# Altium footprint library CAD_Footprints.PcbLib: 39 footprints (part 2 of 3)
Each footprint in its own frame and in the unit in brackets; x right, y up, seen from the top. Pads: shape width x height; smd on the part's side, far side on the other; paste and mask are expansions set on the pad; w line width, h text height; cw(c..) or ccw(c..) is an arc to the next point about the centre after c.
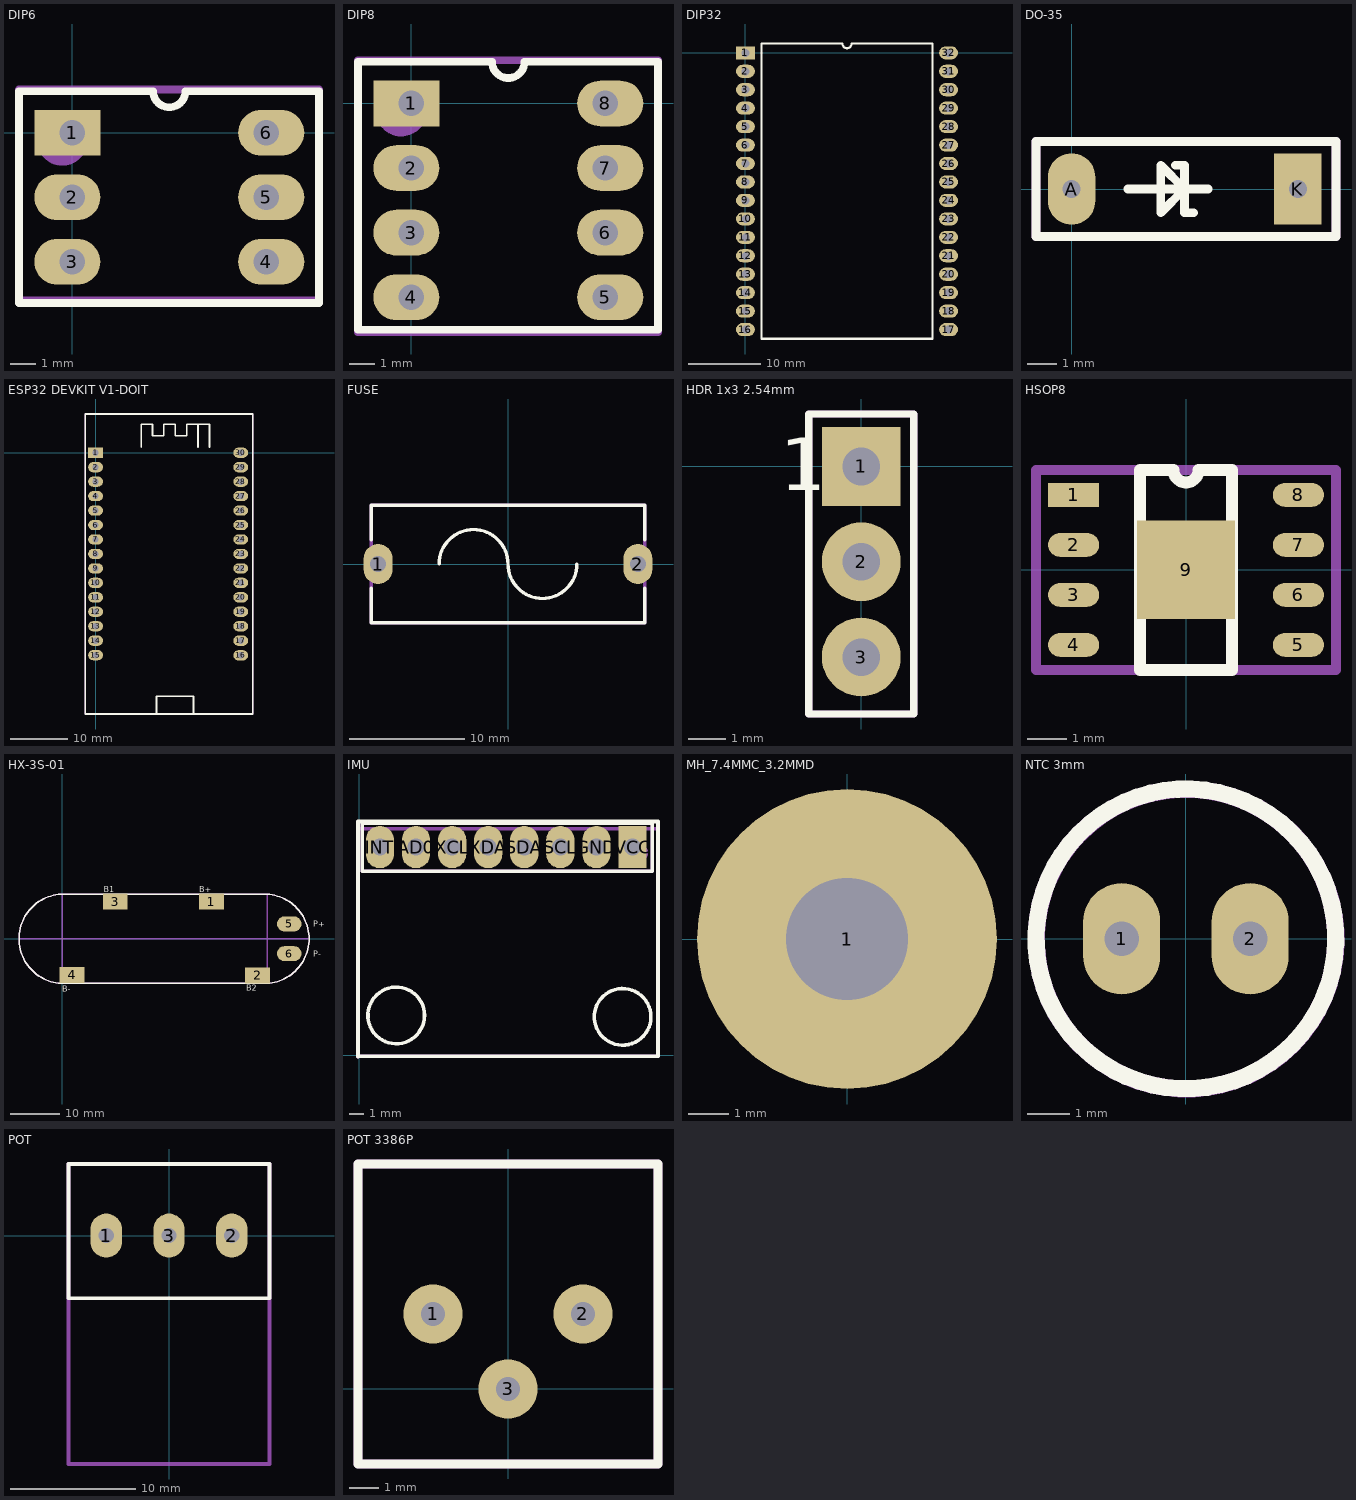
[diagram p1: the footprints below, top view; thin cyan lines are the x and y axes]

## DIP6 [mm]
pads (6):
  rect 2.6x1.8 hole 1 copper offset -0.2,0: 1(0,0)
  oval 2.6x1.8 hole 1 copper offset -0.2,0: 2(0,-2.54) 3(0,-5.08)
  oval 2.6x1.8 hole 1 copper offset 0.2,0: 4(7.62,-5.08) 5(7.62,-2.54) 6(7.62,0)
Top Overlay:
  lines w0.3: -2.1,-6.7 -2.1,1.635 3.175,1.635 ccw(c3.81,1.635) 4.445,1.635 9.7,1.635 9.7,-6.7 -2.1,-6.7
Mechanical 2:
  circle w1: c-0.4,-0.3 r0.5
  lines w0.3: -2.1,-6.6 -2.1,1.7 9.7,1.7 9.7,-6.6 -2.1,-6.6
  text ".Designator" at 3.9,-5.5 h2.5
3D body "DIP6.STEP": height 4.7, standoff -2.6, extent 0,-6.17 7.87,1.09

## DIP8 [mm]
pads (8):
  rect 2.6x1.8 hole 1 copper offset -0.2,0: 1(0,0)
  oval 2.6x1.8 hole 1 copper offset -0.2,0: 2(0,-2.54) 3(0,-5.08) 4(0,-7.62)
  oval 2.6x1.8 hole 1 copper offset 0.2,0: 5(7.62,-7.62) 6(7.62,-5.08) 7(7.62,-2.54) 8(7.62,0)
Top Overlay:
  lines w0.3: -2.1,-8.9 -2.1,1.635 3.175,1.635 ccw(c3.81,1.635) 4.445,1.635 9.7,1.635 9.7,-8.9 -2.1,-8.9
Mechanical 2:
  circle w1: c-0.4,-0.3 r0.5
  lines w0.3: -2.1,-9 9.7,-9 9.7,1.7 -2.1,1.7 -2.1,-9
  text ".Designator" at 3.9,-5.5 h2.5
3D body "DIP6.STEP": height 4.7, standoff -2.6, extent 0,-8.71 7.87,-1.45
3D body "DIP6.STEP": height 4.7, standoff -2.6, extent 0,-6.17 7.87,1.09

## DIP32 [mm]
pads (32):
  rect 2.6x1.8 hole 1.1: 1(0,0)
  oval 2.6x1.8 hole 1.1: 2(0,-2.54) 3(0,-5.08) 4(0,-7.62) 5(0,-10.16) 6(0,-12.7) 7(0,-15.24) 8(0,-17.78) 9(0,-20.32) 10(0,-22.86) 11(0,-25.4) 12(0,-27.94) 13(0,-30.48) 14(0,-33.02) 15(0,-35.56) 16(0,-38.1) 17(27.97,-38.1) 18(27.97,-35.56) 19(27.97,-33.02) 20(27.97,-30.48) 21(27.97,-27.94) 22(27.97,-25.4) 23(27.97,-22.86) 24(27.97,-20.32) 25(27.97,-17.78) 26(27.97,-15.24) 27(27.97,-12.7) 28(27.97,-10.16) 29(27.97,-7.62) 30(27.97,-5.08) 31(27.97,-2.54) 32(27.97,0)
Top Overlay:
  lines w0.3: 2.235,-39.37 25.735,-39.37 25.735,1.27 14.62,1.27 cw(c13.985,1.27) 13.35,1.27 2.235,1.27 2.235,-39.37

## DO-35 [mm]
pads (2):
  oval 1.6x2.4 hole 0.6: A(0,0)
  rect 1.6x2.4 hole 0.6: K(7.62,0)
Top Overlay:
  lines w0.3: 1.9,0 4.6,0 ; 3.5,0.8 3.8,0.8 3.8,-0.8 4.1,-0.8 ; -1.2,-1.6 8.9,-1.6 8.9,1.6 -1.2,1.6 -1.2,-1.6 ; 3,-0.8 3.8,0 3,0.8 3,-0.8
Mechanical 2:
  lines w0.3: -1.2,-1.6 8.9,-1.6 8.9,1.6 -1.2,1.6 -1.2,-1.6
3D body "Diode DO-35 300 mil.step": height 2.01, standoff -2, extent -0.26,-1 7.86,1.012

## ESP32 DEVKIT V1-DOIT [mm]
pads (30):
  rect 2.6x1.8 hole 1.1: 1(0,0)
  oval 2.6x1.8 hole 1.1: 2(0,-2.54) 3(0,-5.08) 4(0,-7.62) 5(0,-10.16) 6(0,-12.7) 7(0,-15.24) 8(0,-17.78) 9(0,-20.32) 10(0,-22.86) 11(0,-25.4) 12(0,-27.94) 13(0,-30.48) 14(0,-33.02) 15(0,-35.56) 16(25.5,-35.6) 17(25.5,-33.02) 18(25.5,-30.48) 19(25.5,-27.94) 20(25.5,-25.4) 21(25.5,-22.86) 22(25.5,-20.32) 23(25.5,-17.78) 24(25.5,-15.24) 25(25.5,-12.7) 26(25.5,-10.16) 27(25.5,-7.62) 28(25.5,-5.08) 29(25.5,-2.54) 30(25.5,0)
Top Overlay:
  lines w0.3: 10.7,-45.9 10.7,-42.8 17.2,-42.8 17.2,-45.8 ; 18,1 18,5 20,5 ; 8,5 10,5 10,3 12,3 12,5 14,5 14,3 16,3 16,5 20,5 ; 8,5 8,1 8,5 ; 20,5 20,1 20,5 ; -1.8,-45.9 -1.8,1.27 -1.8,6.8 27.6,6.8 27.6,-45.9 -1.8,-45.9
Mechanical 2:
  lines w0.3: -1.8,-45.9 27.6,-45.9 27.6,6.8 -1.8,6.8 -1.8,-45.9
  text ".Designator" at 4.403,-15.966 h2
3D body "esp32_dev_kit_v1_asm.stp": height 15.97, standoff 0.96, extent -1.15,-45.25 27,6.25
3D body "m20-7820842_asm.stp": height 8.51, standoff -2.99, extent -1.25,-19.25 1.25,1.47
3D body "m20-7820842_asm.stp": height 8.51, standoff -2.99, extent -1.25,-37.25 1.25,-16.53
3D body "m20-7820842_asm.stp": height 8.51, standoff -2.99, extent 24.25,-37.25 26.75,-16.53
3D body "m20-7820842_asm.stp": height 8.51, standoff -2.99, extent 24.25,-19.25 26.75,1.47

## FUSE [mm]
pads (2):
  oval 2.5x3.5 hole 1.4: 1(-11.3,0) 2(11.3,0)
Top Overlay:
  lines w0.3: -11.9,-2.1 -11.9,-5.1 11.9,-5.1 11.9,-2.1 ; -11.9,2.1 -11.9,5.1 11.9,5.1 11.9,2.1 ; -6,0 cw(c-3,0) 0,0 ccw(c3,0) 6,0
Mechanical 1:
  lines w0.3: -11.9,-5.1 -11.9,5.1 11.9,5.1 11.9,-5.1 -11.9,-5.1
Mechanical 2:
  text ".Designator" at -7.45,-0.55 h1.5
3D body "FUSE-0031.8201.stp": height 11.5, standoff -4, extent -11.55,-4.8 11.55,4.8

## HDR 1x3 2.54mm [mm]
pads (3):
  rect 2.1x2.1 hole 1: 1(0,0)
  round 2.1 hole 1: 2(0,-2.54) 3(0,-5.08)
Top Overlay:
  lines w0.2: -1.4,-6.6 -1.4,1.4 1.4,1.4 1.4,-6.6 -1.4,-6.6
  text "1" at -2.159,-0.635 h1.4
Mechanical 2:
  circle w0.5: c-0.508,0.508 r0.18
  lines w0.2: -1.4,-6.6 -1.4,1.4 1.4,1.4 1.4,-6.6 -1.4,-6.6
  text ".Designator" at 0.5,-5.7 h1
3D body "TSW-103-07-F-S.stp": height 8.39, standoff -2.53, extent -1.27,-6.477 1.27,1.27

## HSOP8 [mm]
pads (9):
  rect 1.3x0.6 smd: 1(-2.854,1.905)
  oval 1.3x0.6 smd: 2(-2.854,0.635) 3(-2.854,-0.635) 4(-2.854,-1.905) 5(2.854,-1.905) 6(2.854,-0.635) 7(2.854,0.635) 8(2.854,1.905)
  rect 2.5x2.5 smd: 9(0,0)
Top Overlay:
  lines w0.3: -1.165,-2.54 -1.165,2.54 -0.318,2.54 ccw(c0,2.54) 0.318,2.54 1.165,2.54 1.165,-2.54 -1.165,-2.54
Mechanical 2:
  lines w0.254: -3.81,-2.54 3.81,-2.54 3.81,2.54 -3.81,2.54 -3.81,2.413 -3.81,-2.54
  text ".Designator" at -3.175,-1.016 h1.52
3D body "User Library-HSOP-8-DDA.step": height 1.7, standoff 0, extent -3.074,-2.346 2.954,2.346

## HX-3S-01 [mm]
pads (6):
  rect 5x3.3 smd: 1(30.1,7.5) 2(39.4,-7.4) 3(10.7,7.5) 4(2,-7.3)
  oval 5x3 smd: 5(45.8,3) 6(45.8,-3)
Top Overlay:
  lines w0.3: 0,-9 41.4,-9 ; 0,9 41.4,9 ; 0.3,-9 cw(c0.3,0) 0.3,9 ; 40.8,-9 ccw(c40.8,0) 40.8,9
  text "P-" at 50.6,-3.6 h1.2
  text "P+" at 50.6,2.4 h1.2
  text "B-" at 0,-10.7 h1.2
  text "B1" at 8.4,9.4 h1.2
  text "B+" at 27.7,9.4 h1.2
  text "B2" at 37.1,-10.5 h1.2
Mechanical 2:
  lines w0.3: -8.4,0 49.6,0 ; 0.3,-9 cw(c0.3,0) 0.3,9 ; 40.8,-9 ccw(c40.8,0) 40.8,9 ; 0,-9 0,9 41.4,9 41.4,-7.2 41.4,-9 0,-9
  text ".Designator" at -0.794,-1.733 h4

## IMU [mm]
pads (8):
  oval 2x3 hole 1.2: AD0(4,14.7) GND(16.75,14.7) INT(1.45,14.7) SCL(14.2,14.7) SDA(11.65,14.7) XCL(6.55,14.7) XDA(9.1,14.7)
  rect 2x3 hole 1.2: VCC(19.3,14.7)
Top Overlay:
  circle w0.254: c18.6,2.7 r2
  circle w0.254: c2.6,2.8 r2
  lines w0.254: -0.1,-0.1 21.1,-0.1 21.1,16.5 -0.1,16.5 -0.1,-0.1 ; 0.2,13 0.2,16.4 20.7,16.4 20.7,13 0.2,13
Mechanical 2:
  circle w0.8: c19.8,14.3 r0.2
  lines w0.254: -0.1,-0.1 -0.1,16 21.1,16 21.1,-0.1 -0.1,-0.1 ; 0.2,13 20.7,13 20.7,16.4 0.2,16.4 0.2,13
  text ".Designator" at 6.3,7.2 h2.8
3D body "m20-7820842_asm.stp": height 8.5, standoff -3, extent 0.05,13.45 20.77,15.95
3D body "User Library-MPU 6050 IMU.STEP": height 14.94, standoff 3.77, extent 0,0 21.107,15.875

## MH_7.4MMC_3.2MMD [mm]
pads (1):
  round 7.4 hole 3: 1(0,0)

## NTC 3mm [mm]
pads (2):
  oval 1.8x2.6 hole 0.8: 1(-1.5,0) 2(1.5,0)
Top Overlay:
  lines w0.4: 2.89,-1.974 cw(c0,0) 2.912,-1.942
Mechanical 2:
  lines w0.4: 2.894,-1.981 cw(c0.004,-0.006) 2.916,-1.949
  text ".Designator" at -2.13,-0.4 h1

## PCBComponent_1 [mm]

## POT [mm]
pads (3):
  oval 2.5x3.5 hole 1.2: 1(-5,0) 2(5,0) 3(0,0)
Top Overlay:
  lines w0.3: -8,-5 8,-5 8,5.7 -8,5.7 -8,-5
Mechanical 2:
  lines w0.3: -7.9,5.7 -8,5.7 ; -8,5.7 8,5.7 8,-18.2 -8,-18.2 -8,5.7
  text ".Designator" at -7.6,3.2 h1.5
3D body "Potentiometer.step": height 21, standoff -3.5, extent -8,-18.2 8,5.8

## POT 3296 [mm]

## POT 3386P [mm]
pads (3):
  round 2 hole 0.8: 1(-2.54,2.54) 2(2.54,2.54) 3(0,0)
Top Overlay:
  lines w0.3: -5.08,-2.54 -5.08,7.62 5.08,7.62 5.08,-2.54 -5.08,-2.54
Mechanical 2:
  lines w0.3: -5.08,-2.54 -5.08,7.62 5.08,7.62 5.08,-2.54 -5.08,-2.54
  text ".Designator" at -2.458,2.207 h1
3D body "User Library-3386P.STEP": height 4.95, standoff -6.27, extent -4.765,-2.165 4.765,7.365